# Altium footprint library SWARMUS_LIB.PcbLib: 114 footprints (part 4 of 8)
Each footprint in its own frame and in the unit in brackets; x right, y up, seen from the top. Pads: shape width x height; smd on the part's side, far side on the other; paste and mask are expansions set on the pad; w line width, h text height; cw(c..) or ccw(c..) is an arc to the next point about the centre after c.
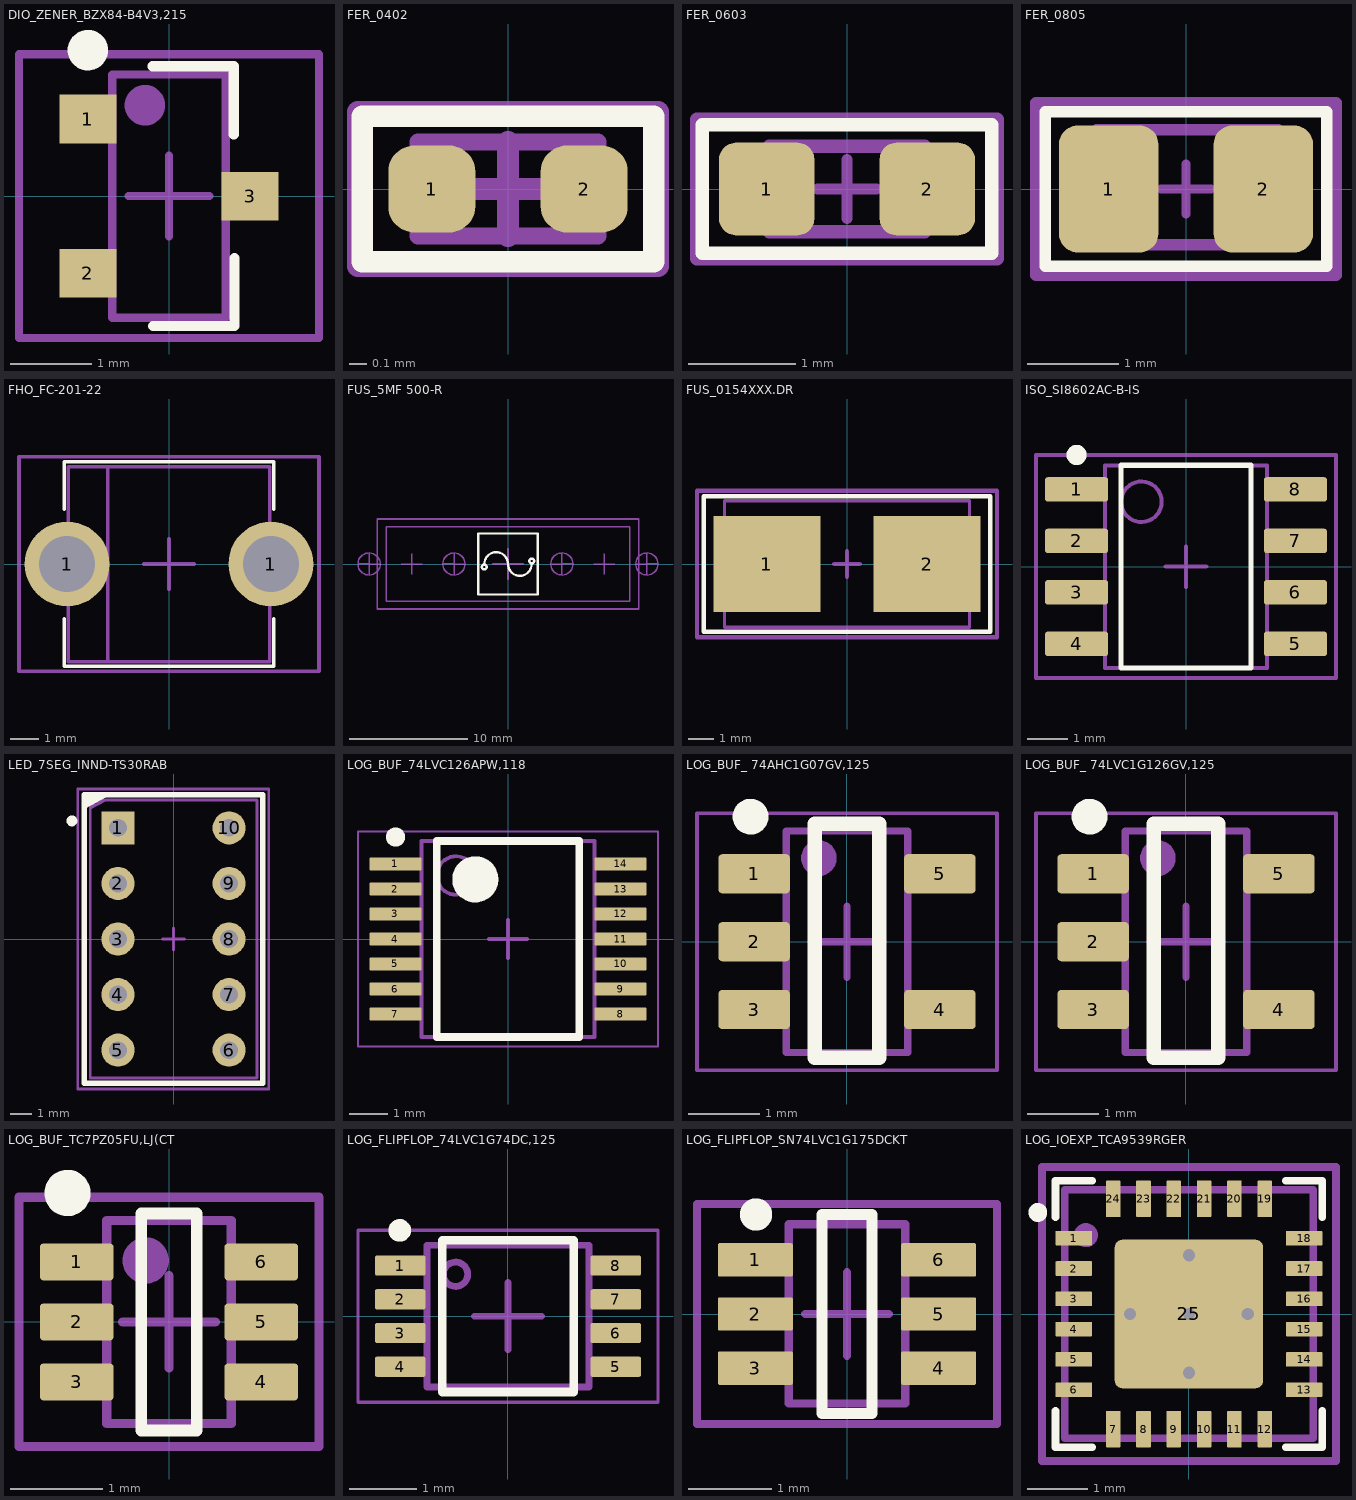
[diagram p3: the footprints below, top view; thin cyan lines are the x and y axes]

## DIO_ZENER_BZX84-B4V3,215 [mm]
height 1.1
pads (3):
  rect 0.7x0.6 smd paste-0.025 mask+0.07: 1(-1,0.95) 2(-1,-0.95) 3(1,0)
Top Overlay:
  circle w0.25: c-1,1.8 r0.125
  lines w0.127: -0.2,1.6 0.8,1.6 0.8,0.764 ; -0.193,-1.602 0.807,-1.602 0.807,-0.765
Top Assembly Drawing:
  circle w0.25: c-0.297,1.12 r0.125
  lines w0.1: -0.7,-1.5 0.7,-1.5 0.7,1.5 -0.7,1.5 -0.7,-1.5
Top Courtyard:
  lines w0.1: -0.5,0 0.5,0 ; 0,-0.5 0,0.5 ; -1.85,-1.75 1.85,-1.75 1.85,1.75 -1.85,1.75 -1.85,-1.75
3D body "SOT95P230X110-3N.step": height 1.1, standoff 0, extent -1.3,-1.5 1.3,1.5

## FER_0402 [mil] "Ferrite - 0402"
height 23.62
pads (2):
  rrect60% 20x20 smd paste+0 mask+1.97: 1(-17.5,0) 2(17.5,0)
Top Overlay:
  lines w5: -33.46,-16.73 -33.46,16.73 33.46,16.73 33.46,-16.73 -33.46,-16.73
Top Assembly Drawing:
  lines w3.94: -20.67,-10.83 -20.67,10.83 20.67,10.83 20.67,-10.83 -20.67,-10.83
Top Courtyard:
  lines w5: -10.83,0 10.83,0 ; 0,-10.83 0,10.83 ; -34.45,-17.72 34.45,-17.72 34.45,17.72 -34.45,17.72 -34.45,-17.72
3D body "44278.stp": height 19.29, standoff -0.39, extent -19.69,-9.84 19.68,9.84

## FER_0603 [mil] "Ferrite - 0603"
height 31.5
pads (2):
  rrect35% 35x34 smd paste+0 mask+1.97: 1(-29.5,0) 2(29.5,0)
Top Overlay:
  lines w5: -53.15,-23.62 53.15,-23.62 53.15,23.62 -53.15,23.62 -53.15,-23.62
Top Assembly Drawing:
  lines w5: -28.54,-15.75 28.54,-15.75 28.54,15.75 -28.54,15.75 -28.54,-15.75
Top Courtyard:
  lines w3.94: -10.83,0 10.83,0 ; 0,-10.83 0,10.83
  lines w5: -55.12,-25.59 55.12,-25.59 55.12,25.59 -55.12,25.59 -55.12,-25.59
3D body "44212.stp": height 31.5, standoff 0, extent -31.49,-15.75 31.5,15.75

## FER_0805 [mil] "Ferrite - 0805"
height 49.21
pads (2):
  rrect37% 43x55 smd paste+0 mask+1.97: 1(-33.5,0) 2(33.5,0)
Top Overlay:
  lines w5: -61.02,-33.46 61.02,-33.46 61.02,33.46 -61.02,33.46 -61.02,-33.46
Top Assembly Drawing:
  lines w5: -38.74,-24.21 -38.74,25.59 40,25.59 40,-24.21 -38.74,-24.21
Top Courtyard:
  lines w3.94: -10.83,0 10.83,0 ; 0,-10.83 0,10.83
  lines w5: -64.96,-37.4 64.96,-37.4 64.96,37.4 -64.96,37.4 -64.96,-37.4
3D body "44133.stp": height 35.43, standoff 0, extent -39.36,-23.62 39.38,23.62

## FHO_FC-201-22 [mm]
pads (2):
  round 3 hole 1.98 mask+0.07: 1(-3.6,0) 1(3.6,0)
Top Overlay:
  lines w0.127: -3.7,-1.93 -3.7,-3.607 3.7,-3.607 3.7,-1.93 ; -3.7,1.93 -3.7,3.607 3.7,3.607 3.7,1.93
Top Assembly Drawing:
  lines w0.127: -2.159,-3.448 -2.159,3.443 ; -3.556,-3.448 -3.556,3.443 3.556,3.443 3.556,-3.448 -3.556,-3.448
Top Courtyard:
  lines w0.127: -0.889,0 0.889,0 ; 0,-0.889 0,0.889 ; -5.3,-3.785 5.3,-3.785 5.3,3.785 -5.3,3.785 -5.3,-3.785
3D body "User Library-littelfuse_102_071.step": height 10.67, standoff -3.56, extent -3.556,-3.448 3.556,3.443

## FUS_5MF 500-R [mm]
Top Overlay:
  circle w0.2: c-2.013,-0.254 r0.2
  circle w0.2: c2.013,0.254 r0.2
  lines w0.2: -2,0 cw(c-1,0) -1,1 cw(c-1,0) 0,0 ccw(c1,0) 1,-1 ccw(c1,0) 2,0 ; -2.515,-2.591 2.515,-2.591 2.515,2.591 -2.515,2.591 -2.515,-2.591
Top Assembly Drawing:
  circle w0.127: c11.775,0 r0.94
  circle w0.127: c4.575,0 r0.94
  circle w0.127: c-11.775,0 r0.94
  circle w0.127: c-4.575,0 r0.94
  lines w0.127: -12.715,0 -11.775,0 ; -11.775,-0.94 -11.775,0 ; -11.775,0.94 -11.775,0 ; -10.835,0 -11.775,0 ; -9.064,0 -7.286,0 ; -8.175,-0.889 -8.175,0.889 ; -5.515,0 -4.575,0 ; -4.575,-0.94 -4.575,0 ; -4.575,0.94 -4.575,0 ; -3.635,0 -4.575,0 ; 3.635,0 4.575,0 ; 4.575,-0.94 4.575,0 ; 4.575,0.94 4.575,0 ; 5.515,0 4.575,0 ; 7.286,0 9.064,0 ; 8.175,-0.889 8.175,0.889 ; 10.835,0 11.775,0 ; 11.775,-0.94 11.775,0 ; 11.775,0.94 11.775,0 ; 12.715,0 11.775,0 ; -10.334,-3.175 10.334,-3.175 10.334,3.175 -10.334,3.175 -10.334,-3.175
  lines w0.152: -5.515,0 -5.515,0 ; 5.515,0 5.515,0
Top Courtyard:
  lines w0.152: -1.27,0 1.27,0 ; 0,-1.27 0,1.27 ; -11.092,-3.81 11.092,-3.81 11.092,3.81 -11.092,3.81 -11.092,-3.81
3D body "5S_MELF_BEL.step": height 9.45, standoff 4.27, extent -10.122,-2.591 10.122,2.591

## FUS_0154XXX.DR [mm] "FUSE BRD MNT 2SMD"
height 3.81
pads (2):
  rect 4.242x3.81 smd paste+0 mask+0.102: 1(-3.185,0) 2(3.185,0)
Top Overlay:
  lines w0.175: -5.7,-2.7 -5.7,2.7 5.7,2.7 5.7,-2.7 -5.7,-2.7
Top Assembly Drawing:
  lines w0.127: -4.877,-2.515 4.877,-2.515 4.877,2.515 -4.877,2.515 -4.877,-2.515
Top Courtyard:
  lines w0.175: -0.508,0 0,0 ; 0,-0.508 0,0 ; 0,0.508 0,0 ; 0.508,0 0,0 ; -5.969,-2.921 -5.969,2.921 5.969,2.921 5.969,-2.921 -5.969,-2.921
3D body "LittleFuseHolderSMD0154.STEP": height 3.69, standoff -0.01, extent -4.85,-2.5 4.85,2.5

## ISO_SI8602AC-B-IS [mm]
pads (8):
  rrect20% 1.55x0.6 smd paste-0.025 mask+0.07: 1(-2.7,1.905) 2(-2.7,0.635) 3(-2.7,-0.635) 4(-2.7,-1.905) 5(2.7,-1.905) 6(2.7,-0.635) 7(2.7,0.635) 8(2.7,1.905)
Top Overlay:
  circle w0.25: c-2.7,2.755 r0.125
  lines w0.127: -1.6,-2.5 1.6,-2.5 1.6,2.5 -1.6,2.5 -1.6,-2.5
Top Assembly Drawing:
  circle w0.1: c-1.1,1.6 r0.5
  lines w0.1: -2,-2.5 2,-2.5 2,2.5 -2,2.5 -2,-2.5
Top Courtyard:
  lines w0.1: -0.5,0 0.5,0 ; 0,-0.5 0,0.5 ; -3.7,-2.75 3.7,-2.75 3.7,2.75 -3.7,2.75 -3.7,-2.75
3D body "SOIC127P600X175-8N.step": height 1.75, standoff 0, extent -3,-2.5 3,2.5

## LED_7SEG_INND-TS30RAB [mm] "100milsx200mils TH"
pads (10):
  rect 1.51x1.51 hole 0.81: 1(-2.54,5.08)
  round 1.51 hole 0.81: 2(-2.54,2.54) 3(-2.54,0) 4(-2.54,-2.54) 5(-2.54,-5.08) 6(2.54,-5.08) 7(2.54,-2.54) 8(2.54,0) 9(2.54,2.54) 10(2.54,5.08)
Top Overlay:
  circle w0.254: c-4.645,5.399 r0.119
  lines w0.254: -4.06,6.086 -3.156,6.584 ; -4.019,6.31 -3.516,6.587 ; -4.075,-6.604 4.075,-6.604 4.075,6.604 -4.075,6.604 -4.075,-6.604
Top Assembly Drawing:
  circle w0.254: c-2.72,5.463 r0.213
  lines w0.127: -3.81,5.974 -3.134,6.346 ; -3.804,6.109 -3.376,6.345 ; -3.789,6.219 -3.608,6.335 ; -3.81,-6.35 3.81,-6.35 3.81,6.35 -3.81,6.35 -3.81,-6.35
Top Courtyard:
  lines w0.127: -0.5,0 0.5,0 ; 0,-0.5 0,0.5 ; -4.375,-6.858 -4.375,6.858 4.35,6.858 4.35,-6.858 -4.375,-6.858
3D body "INND-TS30.stp": height 6.25, standoff -4.35, extent -3.81,-6.35 3.81,6.35

## LOG_BUF_74LVC126APW,118 [mm]
height 1.1
pads (14):
  rrect20% 1.35x0.35 smd paste-0.025 mask+0.07: 1(-2.925,1.95) 2(-2.925,1.3) 3(-2.925,0.65) 4(-2.925,0) 5(-2.925,-0.65) 6(-2.925,-1.3) 7(-2.925,-1.95) 8(2.925,-1.95) 9(2.925,-1.3) 10(2.925,-0.65) 11(2.925,0) 12(2.925,0.65) 13(2.925,1.3) 14(2.925,1.95)
Top Overlay:
  circle w0.6: c-0.85,1.55 r0.3
  circle w0.25: c-2.925,2.65 r0.125
  lines w0.2: -1.85,-2.55 1.85,-2.55 1.85,2.55 -1.85,2.55 -1.85,-2.55
Top Assembly Drawing:
  circle w0.1: c-1.35,1.65 r0.5
  lines w0.1: -2.25,-2.55 2.25,-2.55 2.25,2.55 -2.25,2.55 -2.25,-2.55
Top Courtyard:
  lines w0.05: -3.9,-2.8 3.9,-2.8 3.9,2.8 -3.9,2.8 -3.9,-2.8
  lines w0.1: -0.5,0 0.5,0 ; 0,-0.5 0,0.5
3D body "TSOP65P640X110-14N.step": height 1.1, standoff 0, extent -3.2,-2.55 3.2,2.55

## LOG_BUF_ 74AHC1G07GV,125 [mm]
pads (5):
  rrect20% 1x0.55 smd paste-0.025 mask+0.07: 1(-1.3,0.95) 2(-1.3,0) 3(-1.3,-0.95) 4(1.3,-0.95) 5(1.3,0.95)
Top Overlay:
  circle w0.25: c-1.35,1.75 r0.125
  lines w0.2: -0.45,-1.625 -0.45,1.65 0.45,1.65 0.45,-1.625 -0.45,-1.625
Top Assembly Drawing:
  circle w0.25: c-0.394,1.17 r0.125
  lines w0.1: -0.85,-1.55 -0.85,1.55 0.85,1.55 0.85,-1.55 -0.85,-1.55
Top Courtyard:
  lines w0.05: -2.1,-1.8 2.1,-1.8 2.1,1.8 -2.1,1.8 -2.1,-1.8
  lines w0.1: -0.5,0 0.5,0 ; 0,-0.5 0,0.5
3D body "SOT95P275X110-5N.step": height 1.1, standoff 0, extent -1.5,-1.55 1.5,1.55

## LOG_BUF_ 74LVC1G126GV,125 [mm]
pads (5):
  rrect20% 1x0.55 smd paste-0.025 mask+0.07: 1(-1.3,0.95) 2(-1.3,0) 3(-1.3,-0.95) 4(1.3,-0.95) 5(1.3,0.95)
Top Overlay:
  circle w0.25: c-1.35,1.75 r0.125
  lines w0.2: -0.45,-1.625 -0.45,1.65 0.45,1.65 0.45,-1.625 -0.45,-1.625
Top Assembly Drawing:
  circle w0.25: c-0.394,1.17 r0.125
  lines w0.1: -0.85,-1.55 -0.85,1.55 0.85,1.55 0.85,-1.55 -0.85,-1.55
Top Courtyard:
  lines w0.05: -2.1,-1.8 2.1,-1.8 2.1,1.8 -2.1,1.8 -2.1,-1.8
  lines w0.1: -0.5,0 0.5,0 ; 0,-0.5 0,0.5
3D body "SOT95P275X110-5N.step": height 1.1, standoff 0, extent -1.5,-1.55 1.5,1.55

## LOG_BUF_TC7PZ05FU,LJ(CT [mm]
height 0.9
pads (6):
  rrect20% 0.8x0.4 smd paste-0.05 mask+0.07: 1(-1,0.65) 2(-1,0) 3(-1,-0.65) 4(1,-0.65) 5(1,0) 6(1,0.65)
Top Overlay:
  circle w0.25: c-1.1,1.397 r0.125
  lines w0.127: -0.3,-1.175 0.3,-1.175 0.3,1.175 -0.3,1.175 -0.3,-1.175
Top Assembly Drawing:
  circle w0.25: c-0.253,0.666 r0.125
  lines w0.1: -0.675,-1.1 -0.675,1.1 0.675,1.1 0.675,-1.1 -0.675,-1.1
Top Courtyard:
  lines w0.1: -0.5,0 0.5,0 ; 0,-0.5 0,0.5 ; -1.625,-1.35 -1.625,1.35 1.625,1.35 1.625,-1.35 -1.625,-1.35
3D body "SOT65P210X90-6N.step": height 0.9, standoff 0, extent -1.075,-1.1 1.075,1.1

## LOG_FLIPFLOP_74LVC1G74DC,125 [mm] "VSSOP8"
height 1
pads (8):
  rrect20% 0.75x0.3 smd paste-0.05 mask+0.045: 1(-1.6,0.75) 2(-1.6,0.25) 3(-1.6,-0.25) 4(-1.6,-0.75) 5(1.6,-0.75) 6(1.6,-0.25) 7(1.6,0.25) 8(1.6,0.75)
Top Overlay:
  circle w0.2: c-1.606,1.272 r0.067
  lines w0.127: -0.975,-1.125 0.975,-1.125 0.975,1.125 -0.975,1.125 -0.975,-1.125
Top Assembly Drawing:
  circle w0.1: c-0.778,0.622 r0.18
  lines w0.1: -1.2,-1.05 -1.2,1.05 1.2,1.05 1.2,-1.05 -1.2,-1.05
Top Courtyard:
  lines w0.05: -2.225,-1.275 2.225,-1.275 2.225,1.275 -2.225,1.275 -2.225,-1.275
  lines w0.1: -0.5,0 0.5,0 ; 0,-0.5 0,0.5
3D body "SOP127P600-8N.step": height 1, standoff 0, extent -1.549,-0.95 1.549,0.95

## LOG_FLIPFLOP_SN74LVC1G175DCKT [mm] "SOT23, 6-Leads, Body 2.00x2.10mm, Pitch 0.65mm, IPC Medium Density"
height 1.1
pads (6):
  rrect10% 0.9x0.4 smd paste-0.025 mask+0.05: 1(-1.1,0.65) 2(-1.1,0) 3(-1.1,-0.65) 4(1.1,-0.65) 5(1.1,0) 6(1.1,0.65)
Top Overlay:
  circle w0.25: c-1.092,1.194 r0.068
  lines w0.127: -0.3,-1.194 0.3,-1.194 0.3,1.194 -0.3,1.194 -0.3,-1.194
Top Assembly Drawing:
  lines w0.1: -0.7,-1.075 -0.7,1.075 0.7,1.075 0.7,-1.075 -0.7,-1.075
Top Courtyard:
  lines w0.1: -0.5,0 0.5,0 ; 0,-0.5 0,0.5 ; -1.8,-1.321 -1.8,1.321 1.8,1.321 1.8,-1.321 -1.8,-1.321
3D body "SOT65P210X110-6N.step": height 1.1, standoff 0, extent -1.2,-1.075 1.2,1.075

## LOG_IOEXP_TCA9539RGER [mm] "24 VQFN"
height 0.8
pads (25):
  rrect10% 0.6x0.24 smd paste+0 mask+0.07: 1(-1.9,1.25) 2(-1.9,0.75) 3(-1.9,0.25) 4(-1.9,-0.25) 5(-1.9,-0.75) 6(-1.9,-1.25) 13(1.9,-1.25) 14(1.9,-0.75) 15(1.9,-0.25) 16(1.9,0.25) 17(1.9,0.75) 18(1.9,1.25)
  rrect10% 0.24x0.6 smd paste+0 mask+0.07: 7(-1.25,-1.9) 8(-0.75,-1.9) 9(-0.25,-1.9) 10(0.25,-1.9) 11(0.75,-1.9) 12(1.25,-1.9) 19(1.25,1.9) 20(0.75,1.9) 21(0.25,1.9) 22(-0.25,1.9) 23(-0.75,1.9) 24(-1.25,1.9)
  rrect10% 2.45x2.45 smd paste-5 mask+0.07: 25(0,0)
via 0.97,0 diameter 0.5 hole 0.2
via 0,-0.97 diameter 0.5 hole 0.2
via -0.97,0 diameter 0.5 hole 0.2
via 0,0 diameter 0.5 hole 0.2
via 0,0.97 diameter 0.5 hole 0.2
Top Overlay:
  circle w0.254: c-2.494,1.675 r0.029
  lines w0.127: -2.2,-1.6 -2.2,-2.2 -1.6,-2.2 ; -2.2,1.6 -2.2,2.2 -1.6,2.2 ; 1.6,-2.2 2.2,-2.2 2.2,-1.6 ; 1.6,2.2 2.2,2.2 2.2,1.6
Top Paste:
  rectangle: 0.099,0.1 1.174,1.175
  rectangle: -1.175,0.1 -0.1,1.175
  rectangle: -1.175,-1.174 -0.1,-0.099
  rectangle: 0.099,-1.174 1.174,-0.099
Top Assembly Drawing:
  circle w0.254: c-1.7,1.3 r0.071
  lines w0.127: -2.05,-2.05 2.05,-2.05 2.05,2.05 -2.05,2.05 -2.05,-2.05
Top Courtyard:
  lines w0.127: -0.3,0 0.3,0 ; 0,-0.3 0,0.3 ; -2.425,-2.425 2.425,-2.425 2.425,2.425 -2.425,2.425 -2.425,-2.425
3D body "RTW24_2P45X2P45.stp": height 0.74, standoff 0, extent -2.126,-2.126 2.126,2.126